# Altium footprint library ICL_passives_v1.PcbLib: 102 footprints (part 5 of 7)
Each footprint in its own frame and in the unit in brackets; x right, y up, seen from the top. Pads: shape width x height; smd on the part's side, far side on the other; paste and mask are expansions set on the pad; w line width, h text height; cw(c..) or ccw(c..) is an arc to the next point about the centre after c.
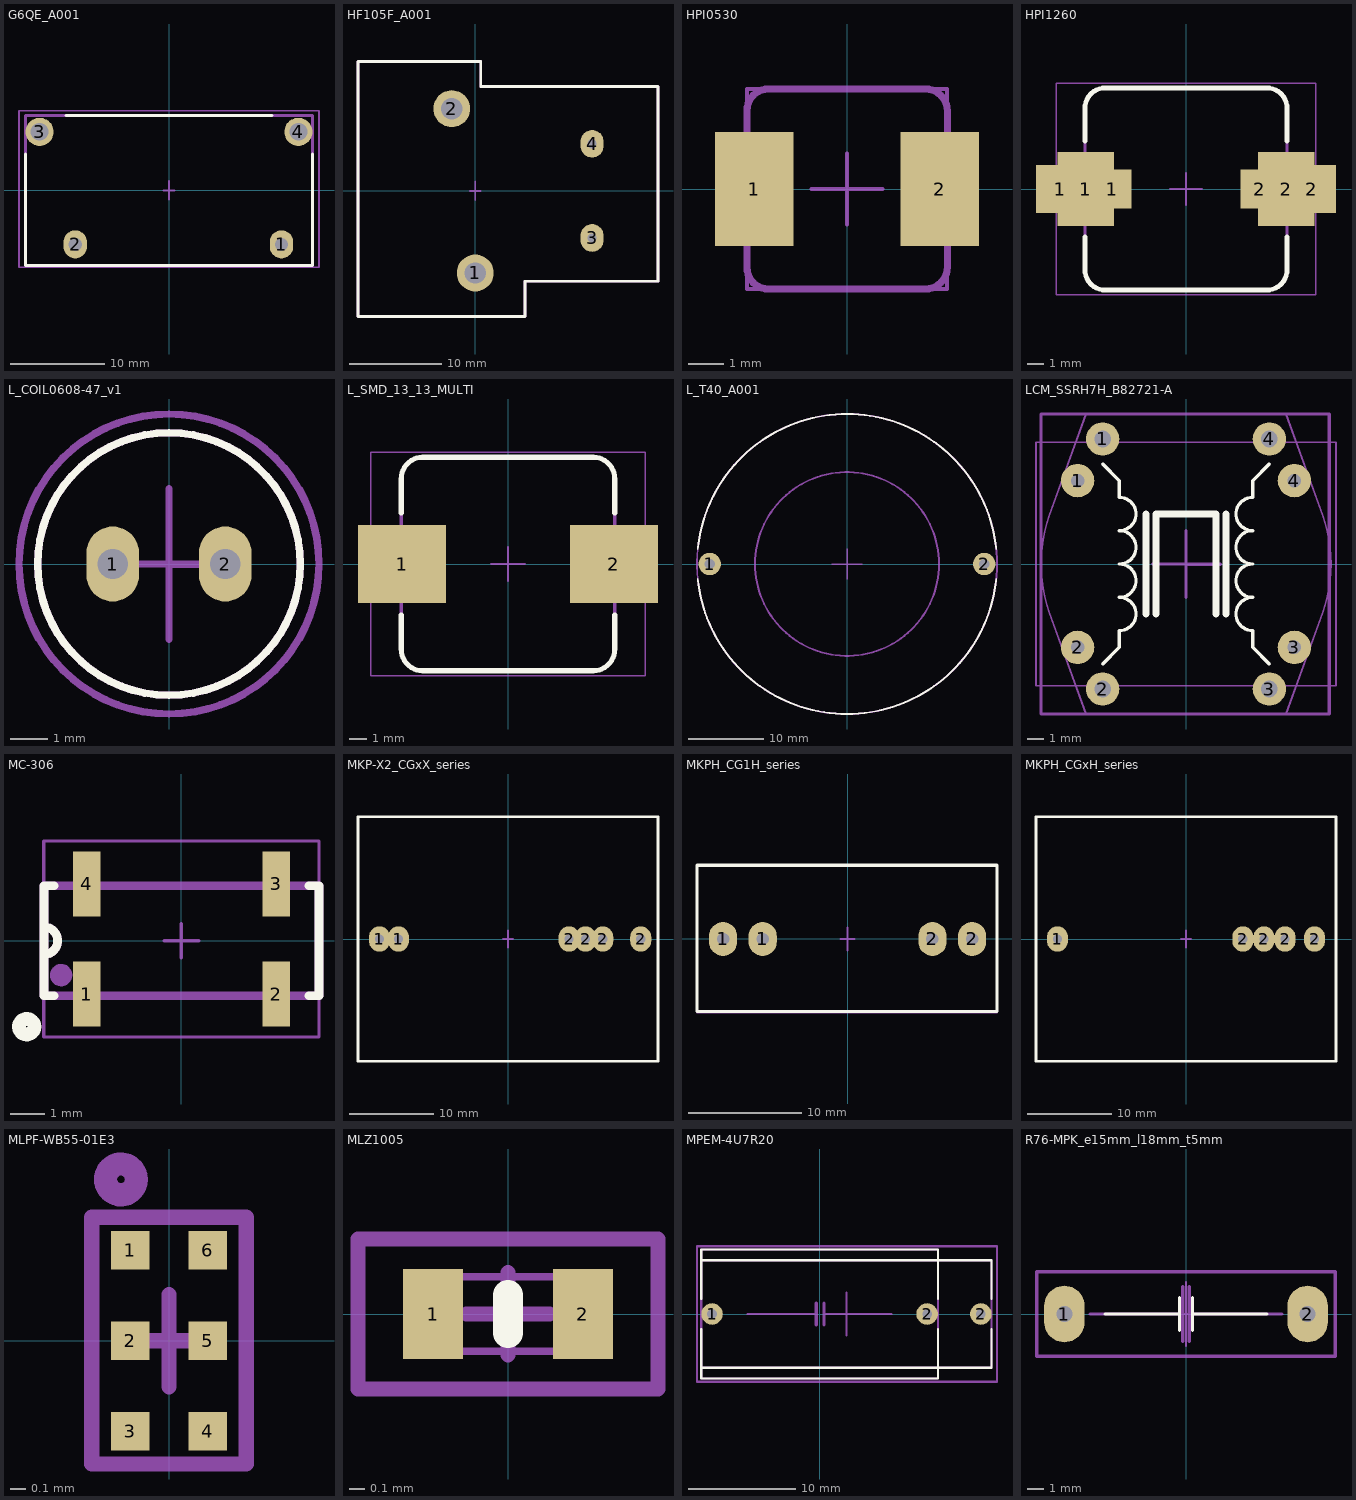
[diagram p4: the footprints below, top view; thin cyan lines are the x and y axes]

## G6QE_A001 [mm] "1pole relay 32A"
pads (4):
  oval 2.5x3 hole 1.4: 1(12,-5.75) 2(-10,-5.75)
  round 3 hole 1.9: 3(-13.8,6.25) 4(13.8,6.25)
Top Overlay:
  lines w0.3: -15.3,3.9 -15.3,-8 15.3,-8 15.3,3.9 ; -11,8 11,8
Top M15-16_SORG:
  lines w0.2: -0.6,0 0.6,0 ; 0,-1 0,1 ; -16,-8.2 16,-8.2 16,8.5 -16,8.5 -16,-8.2
Top M17-18_TDES:
  text "'.Designator'" at -11.33,2.867 h2
Top M19-20_TMOT:
  lines w0.3: -15.3,-8 15.3,-8 15.3,8 -15.3,8 -15.3,-8
3D body "g6qe-1a.stp": height 20.51, standoff -3.49, extent -15.25,-8.1 15.25,7.9

## HF105F_A001 [mm] "1pole relay 20A"
pads (4):
  round 4 hole 2.3: 1(0,-8.9) 2(-2.54,8.9)
  oval 2.5x3 hole 1: 3(12.66,-5.1) 4(12.66,5.1)
Top Overlay:
  lines w0.3: -12.7,-13.6 5.4,-13.6 5.4,-9.8 19.8,-9.8 19.8,11.3 0.6,11.3 0.6,14 -12.7,14 -12.7,-13.6
Top M15-16_SORG:
  lines w0.2: -0.6,0 0.6,0 ; 0,-1 0,1
Top M17-18_TDES:
  text "'.Designator'" at -11.33,2.867 h2
Top M19-20_TMOT:
  lines w0.3: -12.7,-13.6 5.4,-13.6 5.4,-9.8 19.8,-9.8 19.8,11.3 0.6,11.3 0.6,14 -12.7,14 -12.7,-13.6
3D body "790441swp001.stp": height 20.3, standoff -3.9, extent -12.68,-13.55 19.82,13.95

## HPI0530 [mm]
pads (2):
  rect 2.2x3.2 smd: 1(-2.6,0) 2(2.6,0)
Top M11-12_SMOT:
  region: -2.3,1 -3,1 -3,-1 -2.3,-1
  rectangle: 2.3,-1 3,1
  lines w0.2: -2.8,-2.2 ccw(c-2.2,-2.2) -2.2,-2.8 2.196,-2.8 ccw(c2.196,-2.187) 2.81,-2.187 2.81,2.187 ccw(c2.196,2.187) 2.196,2.8 -0.8,2.8 -2.2,2.8 ccw(c-2.2,2.2) -2.8,2.2 -2.8,-2.2
Top M13-14_SDES:
  text "'.Designator'" at -4.532,-0.333 h0.8
Top M15-16_SORG:
  lines w0.1: -1,0 1,0 ; 0,-1 0,1 ; -2.8,-2.8 2.8,-2.8 2.8,2.8 -2.8,2.8 -2.8,-2.8
3D body: height 2, standoff 0, extent -2.9,-1.1 -2.3,1.1
3D body: height 2, standoff 0, extent 2.3,-1.1 2.9,1.1
3D body: height 3, standoff 0, extent -2.8,-2.8 2.8,2.8

## HPI1260 [mm]
pads (6):
  rect 3x3 smd mask+0: 1(-7.85,0) 2(7.85,0)
  rect 3.5x4.6 smd: 1(-6.25,0) 2(6.25,0)
  rect 2.4x2.4 smd mask+0: 1(-4.6,0) 2(4.6,0)
Top Overlay:
  lines w0.3: -6.3,-3 -6.3,-5.03 ccw(c-5.03,-5.03) -5.03,-6.3 5.03,-6.3 ccw(c5.03,-5.03) 6.3,-5.03 6.3,-3 ; -6.3,3 -6.3,5.03 cw(c-5.03,5.03) -5.03,6.3 5.03,6.3 cw(c5.03,5.03) 6.3,5.03 6.3,3
Top M11-12_SMOT:
  region: -6.3,2 -6.9,2 -6.9,-2 -6.3,-2
  rectangle: 6.3,-2 6.9,2
  lines w0.2: -6.3,-5.03 ccw(c-5.03,-5.03) -5.03,-6.3 5.03,-6.3 ccw(c5.03,-5.03) 6.3,-5.03 6.3,3.3 6.3,5.03 ccw(c5.03,5.03) 5.03,6.3 0,6.3 -5.03,6.3 ccw(c-5.03,5.03) -6.3,5.03 -6.3,-5.03
Top M13-14_SDES:
  text "'.Designator'" at -4.532,-0.333 h0.8
Top M15-16_SORG:
  lines w0.1: -1,0 1,0 ; 0,-1 0,1 ; -8.1,-6.6 8.1,-6.6 8.1,6.6 -8.1,6.6 -8.1,-6.6
3D body: height 2, standoff 0, extent -6.9,-2 -6.3,2
3D body: height 2, standoff 0, extent 6.3,-2 6.9,2
3D body: height 4.8, standoff 0, extent -6.3,-6.3 6.3,6.3

## L_COIL0608-47_v1 [mm] "inductor"
pads (2):
  oval 1.4x2 hole 0.8 mask+0.1: 1(-1.5,0) 2(1.5,0)
Top Overlay:
  circle w0.2: c0,0 r3.5
Top M17-18_TDES:
  text "'.Designator'" at -5.465,2.083 h1
Top M19-20_TMOT:
  circle w0.2: c0,0 r3.5
  circle w0.35: c-1.5,0 r0.25
  circle w0.35: c1.5,0 r0.25
Top M25-26_TORG:
  circle w0.2: c0,0 r4
  lines w0.2: -2,0 0,0 ; 0,-2 0,0 ; 0,2 0,0 ; 0.045,-0.013 2.045,-0.013
3D body "COIL0608-47_v1.stp": height 11.01, standoff -2.99, extent -3.749,-3.749 3.75,3.75

## L_SMD_13_13_MULTI [mm]
pads (2):
  rect 5.2x4.6 smd: 1(-6.25,0) 2(6.25,0)
Top Overlay:
  lines w0.3: -6.3,-3 -6.3,-5.03 ccw(c-5.03,-5.03) -5.03,-6.3 5.03,-6.3 ccw(c5.03,-5.03) 6.3,-5.03 6.3,-3 ; -6.3,3 -6.3,5.03 cw(c-5.03,5.03) -5.03,6.3 5.03,6.3 cw(c5.03,5.03) 6.3,5.03 6.3,3
Top M11-12_SMOT:
  rectangle: 6.3,-2 6.9,2
  region: -6.3,2 -6.9,2 -6.9,-2 -6.3,-2
  lines w0.2: -6.3,-5.03 ccw(c-5.03,-5.03) -5.03,-6.3 5.03,-6.3 ccw(c5.03,-5.03) 6.3,-5.03 6.3,3.3 6.3,5.03 ccw(c5.03,5.03) 5.03,6.3 0,6.3 -5.03,6.3 ccw(c-5.03,5.03) -6.3,5.03 -6.3,-5.03
Top M13-14_SDES:
  text "'.Designator'" at -4.532,-0.333 h0.8
Top M15-16_SORG:
  lines w0.1: -1,0 1,0 ; 0,-1 0,1 ; -8.1,-6.6 -8.1,6.6 8.1,6.6 8.1,-6.6 -8.1,-6.6
3D body: height 4.8, standoff 0, extent -6.3,-6.3 6.3,6.3
3D body: height 2, standoff 0, extent 6.3,-2 6.9,2
3D body: height 2, standoff 0, extent -6.9,-2 -6.3,2

## L_T40_A001 [mm] "inductor"
pads (2):
  round 3 hole 1.4 mask+0.1: 1(-18.3,0) 2(18.3,0)
Top Overlay:
  lines w0.254: -19.901,-1.99 ccw(c0,0) 19.9,-2 ; -19.9,2 cw(c0,0) 19.901,1.99
Top M15-16_SORG:
  circle w0.254: c0,0 r20
  lines w0.2: -2,0 0,0 ; 0,-2 0,0 ; 0,2 0,0 ; 0.045,-0.013 2.045,-0.013
Top M17-18_TDES:
  text "'.Designator'" at -11.23,-0.633 h2
Top M19-20_TMOT:
  circle w0.254: c0,0 r12.256
  circle w0.254: c0,0 r20
3D body "784487swp001.stp": height 21.29, standoff -4.7, extent -20,-20 20,20

## LCM_SSRH7H_B82721-A [mm]
pads (8):
  round 2 hole 0.8 mask+0.1: 1(-6.5,5) 2(-6.5,-5) 3(6.5,-5) 4(6.5,5)
  round 2 hole 1 mask+0.1: 1(-5,7.5) 2(-5,-7.5) 3(5,-7.5) 4(5,7.5)
Top Overlay:
  lines w0.2: -5,-6 -4,-5 -4,-4 ccw(c-4,-3) -4,-2 ccw(c-4,-1) -4,0 ccw(c-4,1) -4,2 ccw(c-4,3) -4,4 -4,5 -5,6 ; 5,-6 4,-5 4,-4 cw(c4,-3) 4,-2 cw(c4,-1) 4,0 cw(c4,1) 4,2 cw(c4,3) 4,4 4,5 5,6
  lines w0.4: -2.4,-3 -2.4,3 ; -1.8,-3 -1.8,3 1.8,3 1.8,-3 ; 2.4,-3 2.4,3
Top M15-16_SORG:
  lines w0.2: -2,0 0,0 ; 0,-2 0,0 ; 0,2 0,0 ; 0.045,-0.013 2.045,-0.013 ; -8.7,-9 -8.7,9 8.6,9 8.6,-9 -8.7,-9
Top M17-18_TDES:
  text "'.Designator'" at -11.23,-0.633 h2
Top M19-20_TMOT:
  lines w0.1: -8.202,-2.9 cw(c0,0) -8.202,2.901 ; -8.202,-2.9 -6,-9 6,-9 8.2,-2.9 ; -8.2,2.9 -6,9 6,9 8.202,2.9 ; 8.202,-2.901 ccw(c0,0) 8.202,2.9 ; -9,-7.3 -0.3,-7.3 9,-7.3 9,7.3 -9,7.3 -9,-7.3
3D body "Epcos_B82721A.step": height 12.62, standoff -3.19, extent -8.65,-8.95 8.65,8.95
3D body "SSRH7H-M04596.step": height 12.01, standoff -3.49, extent -9,-7.201 9,7.3

## MC-306 [mm]
pads (4):
  rect 0.8x1.9 smd: 1(-2.75,-1.55) 2(2.75,-1.55) 3(2.75,1.65) 4(-2.75,1.65)
Top Overlay:
  circle w0.4: c-4.5,-2.5 r0.224
  lines w0.254: -4,-0.4 ccw(c-4,0) -4,0.4 ; -3.7,-1.6 -4,-1.6 -4,1.6 -3.7,1.6 ; 3.7,-1.6 4,-1.6 4,1.6 3.7,1.6
Top M11-12_SMOT:
  circle w0.35: c-3.5,-1 r0.15
  region: -2.4,-1 -3.1,-1 -3.1,-1.9 -2.4,-1.9
  rectangle: -3.1,1 -2.4,1.9
  region: 3.1,-1 2.4,-1 2.4,-1.9 3.1,-1.9
  rectangle: 2.4,1 3.1,1.9
  lines w0.254: -4,-0.4 ccw(c-4,0) -4,0.4 ; -4,-1.6 -4,1.6 4,1.6 4,-1.6 -4,-1.6
Top M13-14_SDES:
  text "'.Designator'" at -4.532,-0.333 h0.8
Top M15-16_SORG:
  lines w0.1: -0.5,0 0.5,0 ; 0,-0.5 0,0.5 ; -4,-2.8 4,-2.8 4,2.9 -4,2.9 -4,-2.8
3D body "User Library-mc-306 crystal.step": height 2.54, standoff -0.03, extent -4,-1.901 4,1.901

## MKP-X2_CGxX_series [mm] "Universal footprint for CG-ELEC dc bus cap"
pads (6):
  oval 2.5x3 hole 1.1: 1(-15.25,0) 1(-13,0) 2(7.25,0) 2(9.2,0) 2(11.25,0) 2(15.75,0)
Top Overlay:
  lines w0.3: -17.8,-14.5 -17.8,14.5 17.8,14.5 17.8,-14.5 -17.8,-14.5
Top M15-16_SORG:
  lines w0.2: -0.6,0 0.6,0 ; 0,-1 0,1
Top M17-18_TDES:
  text "'.Designator'" at -11.93,4.567 h2
Top M19-20_TMOT:
  lines w0.2: -17.8,-14.5 17.8,-14.5 17.8,14.5 -17.8,14.5 -17.8,-14.5
3D body "MKP_X2_CGxX_CG-ELEC_v1.stp": height 28.01, standoff -3.49, extent -17.75,-14.5 17.75,14.5

## MKPH_CG1H_series [mm] "Universal footprint for CG-ELEC snubber cap."
pads (4):
  oval 2.5x3 hole 1.1: 1(-11,0) 1(-7.5,0) 2(7.5,0) 2(11,0)
Top Overlay:
  lines w0.3: -13.3,-6.4 13.2,-6.4 13.2,6.5 -13.3,6.5 -13.3,-6.4
Top M15-16_SORG:
  lines w0.2: -0.6,0 0.6,0 ; 0,-1 0,1
Top M17-18_TDES:
  text "'.Designator'" at -11.33,2.867 h2
Top M19-20_TMOT:
  lines w0.2: -13.3,-6.5 -13.3,6.5 13.2,6.5 13.2,-6.5 -13.3,-6.5
3D body "MKPH_CG1H_CG-ELEC_v1.stp": height 21.01, standoff -3.49, extent -13.25,-6.5 13.25,6.5

## MKPH_CGxH_series [mm] "Universal footprint for CG-ELEC resonant cap"
pads (5):
  oval 2.5x3 hole 1.1: 1(-15.25,0) 2(6.75,0) 2(9.25,0) 2(11.75,0) 2(15.25,0)
Top Overlay:
  lines w0.3: -17.8,-14.5 -17.8,14.5 17.8,14.5 17.8,-14.5 -17.8,-14.5
Top M15-16_SORG:
  lines w0.2: -0.6,0 0.6,0 ; 0,-1 0,1
Top M17-18_TDES:
  text "'.Designator'" at -11.93,4.567 h2
Top M19-20_TMOT:
  lines w0.2: -17.8,-14.5 17.8,-14.5 17.8,14.5 -17.8,14.5 -17.8,-14.5
3D body "MKPH_CGxH_CG-ELEC_v1.stp": height 28.01, standoff -3.49, extent -17.75,-14.5 17.75,14.5

## MLPF-WB55-01E3 [mm] "st lpg FILTER"
pads (6):
  rect 0.25x0.25 smd: 1(-0.25,0.587) 2(-0.25,0) 3(-0.25,-0.587) 4(0.25,-0.587) 5(0.25,0) 6(0.25,0.587)
Top M11-12_SMOT:
  circle w0.15: c-0.312,1.047 r0.1
  rectangle: 0.163,-0.674 0.335,-0.497
  rectangle: -0.337,-0.674 -0.165,-0.497
  rectangle: 0.163,-0.087 0.335,0.09
  rectangle: -0.337,-0.087 -0.165,0.09
  rectangle: 0.163,0.5 0.335,0.677
  rectangle: -0.337,0.5 -0.165,0.677
  lines w0.1: -0.5,-0.8 -0.5,0.8 0.5,0.8 0.5,-0.8 -0.5,-0.8
Top M13-14_SDES:
  text "'.Designator'" at -2.932,1.292 h0.5
Top M15-16_SORG:
  lines w0.1: -0.3,0 0,0 ; 0,-0.3 0,0 ; 0,0.3 0,0 ; 0.3,0 0,0
3D body: height 0.41, standoff 0, extent -0.4,0.5 -0.2,0.7
3D body: height 0.4, standoff 0.01, extent -0.5,-0.8 0.5,0.8

## MLZ1005 [mm] "inductor murata"
height 0.37
pads (2):
  rect 0.4x0.6 smd: 1(-0.5,0) 2(0.5,0)
Top Overlay:
  lines w0.2: 0,-0.125 0,0.125
Top M11-12_SMOT:
  rectangle: -0.5,-0.25 -0.4,0.25
  rectangle: 0.4,-0.25 0.5,0.25
  lines w0.05: -0.5,-0.25 -0.5,0.25 0.5,0.25 0.5,-0.25 -0.5,-0.25
Top M13-14_SDES:
  text "'.Designator'" at -2.266,-0.167 h0.4
Top M15-16_SORG:
  lines w0.1: -0.275,0 0.275,0 ; 0,-0.275 0,0.275 ; -1,-0.5 -1,0.5 1,0.5 1,-0.5 -1,-0.5
3D body "0402(1005M)R.step": height 0.52, standoff 0.01, extent -0.514,-0.254 0.502,0.254

## MPEM-4U7R20 [mm] "4u7/100V e = 20mm"
pads (3):
  round 2 hole 0.9: 1(-10,0) 2(10,0) 2(15,0)
Top Overlay:
  lines w0.2: -11,-5 16,-5 16,-1.4 ; -11,-1.4 -11,-6 11,-6 11,-1.4 ; -11,1.4 -11,6 11,6 11,1.4 ; -10.9,5 16,5 16,1.4
Top M15-16_SORG:
  lines w0.2: 0.5,0 2.5,0 ; 2.5,-2 2.5,0 ; 2.5,2 2.5,0 ; 4.5,0 2.5,0 ; -11.4,-6.3 -11.4,0 -11.4,6.3 16.5,6.3 16.5,-6.3 -11.4,-6.3
Top M17-18_TDES:
  text "'.Designator'" at -11.23,2.567 h2
Top M19-20_TMOT:
  lines w0.2: -11,-5 16,-5 16,5 -11,5 ; -6.7,0 -0.4,0 ; 0.4,0 6.7,0 ; -11,-6 11,-6 11,6 -11,6 -11,-6
  lines w0.3: -0.3,-1 -0.3,1 ; 0.4,-1 0.4,1
3D body "MPEM-4U7R25.stp": height 20.7, standoff -2.3, extent -11.5,-5 16.5,5
3D body "MPEM-4U7R20.stp": height 22.3, standoff -2.3, extent -11.5,-6 11.5,6

## R76-MPK_e15mm_l18mm_t5mm [mm]
pads (2):
  oval 2.5x3.5 hole 1 paste-1: 1(-7.5,0) 2(7.5,0)
Top Overlay:
  lines w0.2: -5,0 -0.4,0 ; -0.4,-1 -0.4,1 ; 0.4,-1 0.4,1 ; 0.4,0 5,0
Top M15-16_SORG:
  lines w0.1: -2,0 0,0 ; 0,-2 0,0 ; 0,2 0,0 ; 2,0 0,0 ; -9.2,-2.6 9.2,-2.6 9.2,2.6 -9.2,2.6 -9.2,-2.6
Top M17-18_TDES:
  text "'.Designator'" at -7.165,-2.017 h1
Top M19-20_TMOT:
  lines w0.2: -5.9,0 -0.2,0 ; -0.2,-1.7 -0.2,1.7 ; 0.2,-1.701 0.2,1.699 ; 0.2,0 5.9,0 ; -9.2,-2.6 9.2,-2.6 9.2,2.6 -9.2,2.6 -9.2,-2.6
3D body "R76TI210050H4J.step": height 11.11, standoff -2.59, extent -9.15,-2.6 9.15,2.605